# Altium integrated library Integrated_Library1.IntLib: 249 symbols (part 1 of 4) (continued)
## LM5141RGER
designator U?  (value not drawn)
Manufacturer: TI(德州仪器); Add into BOM: yes; Function: 降压型; Input Voltage: 3.8V~65V; Switching Frequency: 440kHz；2.2MHz; Synchronous Rectification: 否; Number of Outputs: 1; Topology: 降压式; Switch tube (built-in/external): 外置; Symbol: LM5141RGER; Device: LM5141RGER; LCSC Part Name: LM5141RGER; Supplier Part: C2658020; Manufacturer Part: LM5141RGER; Supplier Footprint: VQFN-24-EP(4x4); JLCPCB Part Class: Extended Part; Datasheet: https://www.ti.com/cn/lit/gpn/lm5141; Supplier: LCSC; Convert to PCB: yes; Operating Temperature: -40℃~+150℃@(TJ)
footprint VQFN-24_L4.0-W4.0-P0.50-TL-EP2.5
3D model VQFN-24_L4.0-W4.0-P0.50-TL-EP2.5
pins: 1 DEMB, 2 VDDA, 3 AGND, 4 RT, 5 DITH, 6 OSC, 7 LOL, 8 LO, 9 PGND, 10 VCC, 11 HB, 12 SW, 13 HO, 14 HOL, 15 VIN, 16 VCCX, 17 VOUT, 18 CS, 19 FB, 20 COMP, 21 PG, 22 SS, 23 EN, 24 RES, 25 EP

## LM5146RGYR
designator U?  (value not drawn)
Manufacturer: TI(德州仪器); Add into BOM: yes; Function: 降压型; Input Voltage: 5.5V~100V; Switching Frequency: 1MHz; Synchronous Rectification: 是; Number of Outputs: 1; Topology: 降压式; Switch tube (built-in/external): 外置; Symbol: LM5146RGYR; Device: LM5146RGYR; LCSC Part Name: LM5146RGYR; Supplier Part: C3188679; Manufacturer Part: LM5146RGYR; Supplier Footprint: VQFN-20(3.5x4.5); JLCPCB Part Class: Extended Part; Datasheet: https://www.ti.com/cn/lit/gpn/lm5146; Supplier: LCSC; Convert to PCB: yes; Operating Temperature: -40℃~+150℃@(TJ)
footprint VQFN-20_L4.5-W3.5-P0.50-BL-EP
3D model VQFN-20_L4.5-W3.5-H1.0-P0.50-BL-EP
pins: 1 EN/UVLO, 2 RT, 3 SS/TRK, 4 COMP, 5 FB, 6 AGND, 7 SYNCOUT, 8 SYNCIN, 9 NC, 10 PGOOD, 11 ILIM, 12 PGND, 13 LO, 14 VCC, 15 EP, 16 NC, 17 BST, 18 HO, 19 SW, 20 VIN, 21 EP

## LM25116MHX/NOPB
designator U?  (value not drawn)
Manufacturer: TI(德州仪器); Add into BOM: yes; Function: 降压型; Input Voltage: 6V~42V; Switching Frequency: 1MHz; Synchronous Rectification: 是; Number of Outputs: 1; Topology: 降压式; Switch tube (built-in/external): 外置; Symbol: LM25116MHX/NOPB; Device: LM25116MHX/NOPB; LCSC Part Name: LM25116MHX/NOPB; Supplier Part: C390951; Manufacturer Part: LM25116MHX/NOPB; Supplier Footprint: HTSSOP-20-EP; JLCPCB Part Class: Extended Part; Datasheet: https://www.ti.com/cn/lit/gpn/lm25116; Supplier: LCSC; Convert to PCB: yes; Operating Temperature: -40℃~+125℃@(TJ)
footprint HTSSOP-20_L6.5-W4.4-P0.65-LS6.4-BL-EP
3D model HTSSOP-20_L6.5-W4.4-H1.2-LS6.4-P0.65
pins: 1 VIN, 2 UVLO, 3 RT/SYNC, 4 EN, 5 RAMP, 6 AGND, 7 SS, 8 FB, 9 COMP, 10 VOUT, 11 DEMB, 12 CS, 13 CSG, 14 PGND, 15 LO, 16 VCC, 17 VCCX, 18 HB, 19 HO, 20 SW, 21 EP

## LM66100DCKR
designator U?  (value not drawn)
理想二极管; Manufacturer: TI(德州仪器); Device: LM66100DCKR_C2869734; Add into BOM: yes; Number of Outputs: 1; Control Input Logic: 低电平有效; Output Current: 1.5A; Input Voltage: 1.5V~5.5V; Resistor On-State: 79mΩ; Symbol: LM66100DCKR; LCSC Part Name: 5.5V 1.5A 低静态电流理想二极管; Supplier Part: C2869734; Manufacturer Part: LM66100DCKR; Supplier Footprint: SC-70-6; JLCPCB Part Class: Extended Part; Datasheet: https://www.ti.com/cn/lit/gpn/lm66100; Supplier: LCSC; Convert to PCB: yes; Switch Type: 理想二极管; Operating Temperature	-: -40℃~+125℃
footprint SC-70-6_L2.0-W1.3-P0.65-LS2.1-BL
3D model SC-70-6_L2.0-W1.3-P0.65-LS2.1-BL
pins: 1 VIN, 2 GND, 3 CE#, 4 NC, 5 ST, 6 VOUT

## LT3790
designator U?, comment LT3790EFE
DC-DC BUCK-BOOST芯片
footprint TSSOP38
pins: BG1, BG2, BST1, BST2, C/10, CCM, CLKOUT, CTRL, EN, FB, INTVcc, ISMON, ISN, ISP, IVINMON, IVINN, IVINP, OVLO, PGND, PGND, PWM, PWMOUT, RT, SGND, SHORT, SNSN, SNSP, SS, SW1, SW2, SYNC, TG1, TG2, Vc, VIN, Vref
text: -; +; SHDN_INT; REGS; A=20; A2; A1; A=24; ISMON_INT; IVINMON_INT; TSD; A13; A3; 3uA; A4; 1.2V; BUCK; LOGIC; SS_R/S; INTVCC; A14; SLOPE_COMP_BUCK; A15; BOOST; SLOPE_COMP_BOOST; A16; OSC; 0.4V; A7; A5; A10; 0.1V; A6; A11; 0.2V; 14uA; A8; A12; R; SS_R; Q; S; SS_S; A9; 3V; 1.75V; A18

## LTC1473
designator U?
功率电子开关
footprint 16P 0.635mm SSOP
pins: 1 IN1, 2 IN2, 3 DIODE, 4 TIMER, 5 V+, 6 Vgg, 7 SW, 8 GND, 9 GB2, 10 SAB2, 11 GA2, 12 SEN-, 13 SEN+, 14 GB1, 15 SAB1, 16 GA1

## LTC4357CDCB
designator U?
功率电子开关
footprint DFN-6_2x3_0.5
pins: 1 OUT, 2 IN, 3 GATE, 4 GND, 5 NC, 6 VDD, 7 EP

## LTC4357CMS8#PBF
designator U?  (value not drawn)
功率电子开关; Manufacturer: ADI(亚德诺); Add into BOM: yes; Input Voltage: 9V~80V; Symbol: LTC4357CMS8#PBF; Device: LTC4357CMS8#PBF; LCSC Part Name: LTC4357CMS8#PBF; Supplier Part: C107961; Manufacturer Part: LTC4357CMS8#PBF; Supplier Footprint: MSOP-8; JLCPCB Part Class: Extended Part; Datasheet: https://atta.szlcsc.com/upload/public/pdf/source/20170413/1492062869392.pdf; Supplier: LCSC; Convert to PCB: yes; Operating Temperature	-: 0℃~+70℃
footprint MSOP-8_L3.0-W3.0-P0.65-LS4.9-BL
pins: 1 IN, 2 NV, 3 NC, 4 GATE, 5 GND, 6 NC, 7 VDD, 8 OUT

## LTC4444EMS8E#PBF
designator U?  (value not drawn)
栅极驱动器; Manufacturer: ADI(亚德诺); Add into BOM: yes; Driven Configuration: 半桥; Load Type: MOSFET; Number of Drivers: 2; Peak Output Current(sink): 3A; Peak Output Current(source): 2.5A; Supply Voltage: 7.2V~13.5V; Rise Time: 8ns; Fall Time: 5ns; Symbol: LTC4444EMS8E#PBF; Device: LTC4444EMS8E#PBF; LCSC Part Name: 高电压同步 N 沟道 MOSFET 驱动器; Supplier Part: C107974; Manufacturer Part: LTC4444EMS8E#PBF; Supplier Footprint: MSOP-8-EP; JLCPCB Part Class: Extended Part; Datasheet: https://atta.szlcsc.com/upload/public/pdf/source/20170413/1492062873617.pdf; Supplier: LCSC; Convert to PCB: yes; Operating Temperature: -40℃~+125℃@(Tj)
footprint MSOP-8_L3.0-W3.0-P0.65-LS5.0-BL-EP
3D model MSOP-8_L3.0-W3.0-P0.65-LS5.0-BR-EP
pins: 1 TINP, 2 BINP, 3 VCC, 4 BG, 5 NC, 6 BOOST, 7 TG, 8 TS, 9 EP

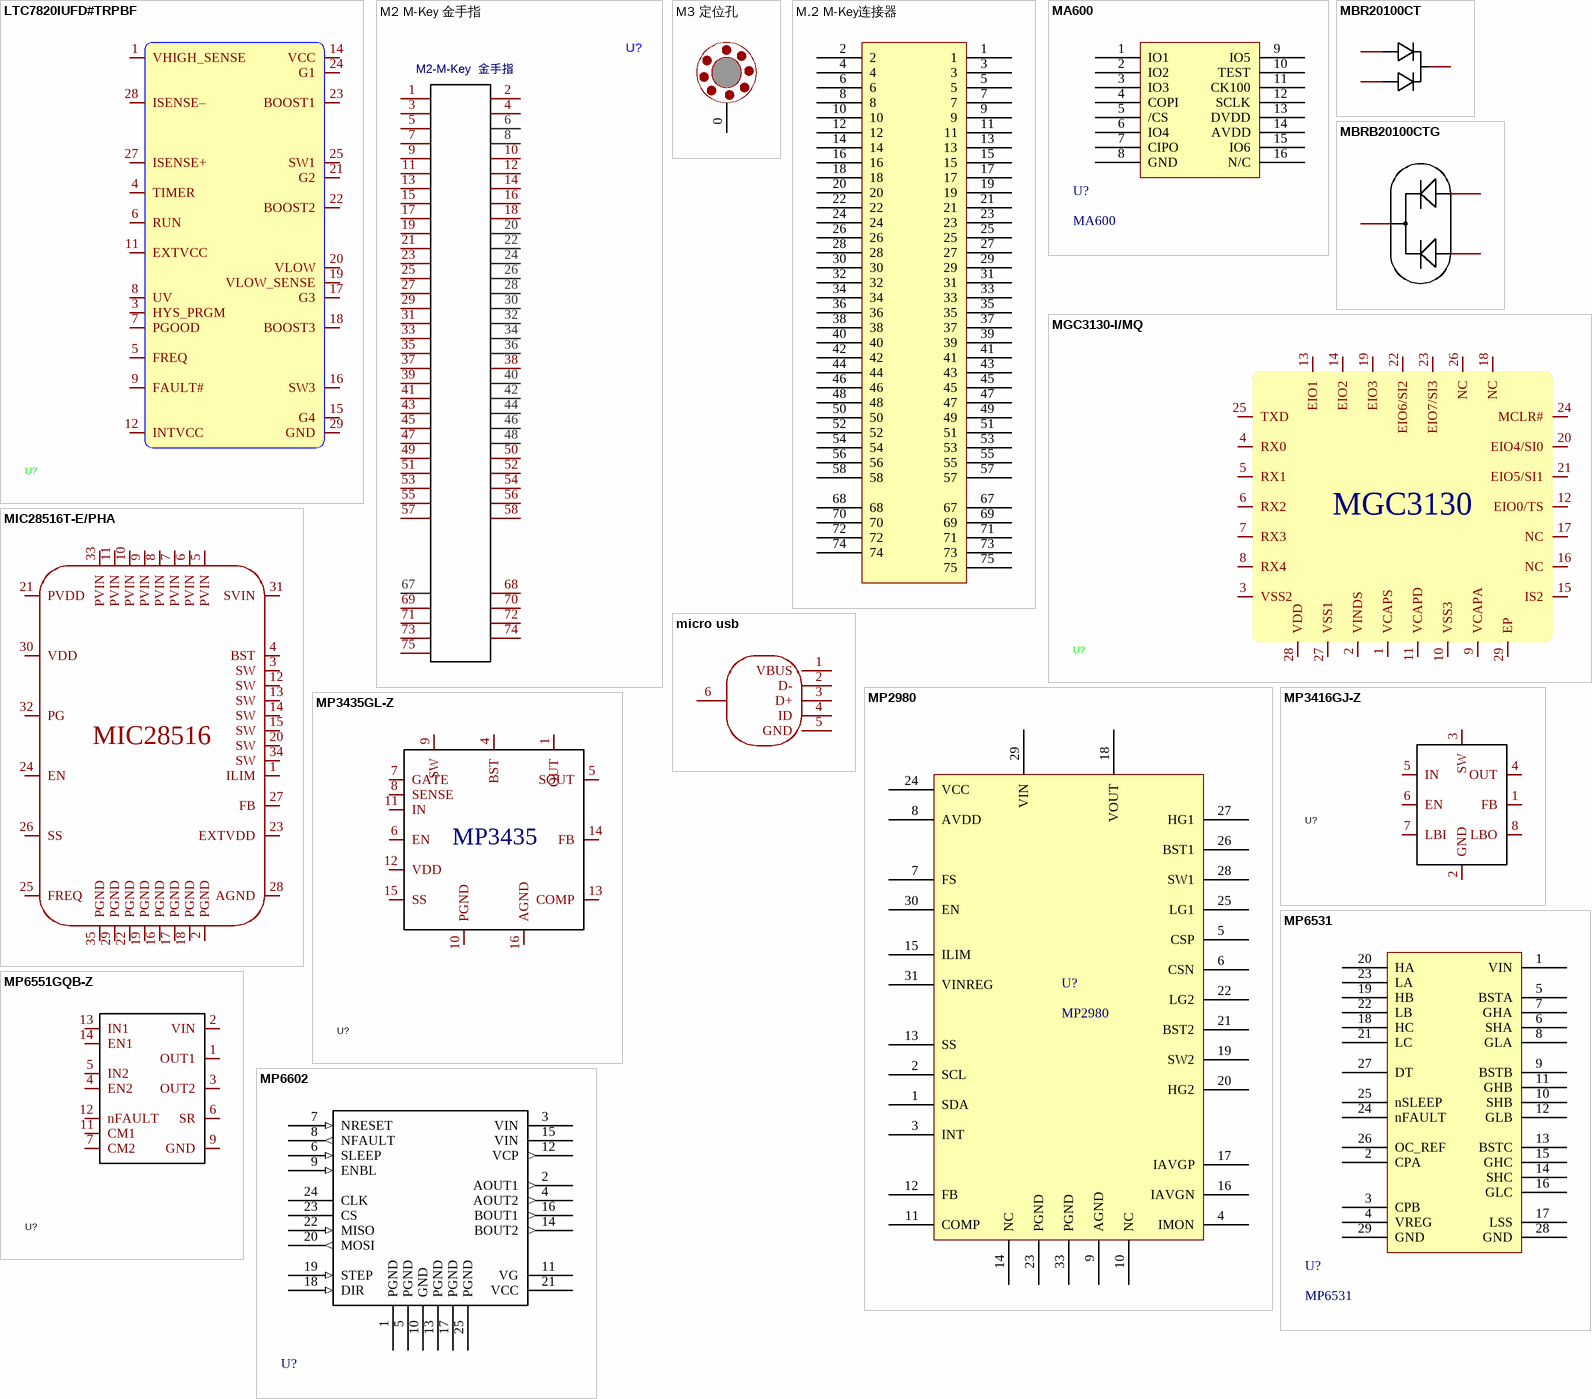
[diagram p5: symbols LTC7820IUFD#TRPBF to MP6602]

## LTC7820IUFD#TRPBF
designator U?  (value not drawn)
Manufacturer: ADI(亚德诺); Add into BOM: yes; Input Voltage: 6V~72V; Switching Frequency: 100kHz~1MHz; Synchronous Rectification: 否; Number of Outputs: 1; Switch tube (built-in/external): 外置; Symbol: LTC7820IUFD#TRPBF; Device: LTC7820IUFD#TRPBF; LCSC Part Name: 高效率非隔离中间总线转换器; Supplier Part: C690244; Manufacturer Part: LTC7820IUFD#TRPBF; Supplier Footprint: QFN-28-EP(4x5); JLCPCB Part Class: Extended Part; Datasheet: https://atta.szlcsc.com/upload/public/pdf/source/20210527/C690244_405FC637E178150A18F1B63D64F3DC46.pdf; Supplier: LCSC; Convert to PCB: yes; Function: -; Output Type: -; Output Voltage: -; Output Current: -; Operating Temperature: -40℃~+125℃; Topology: -; Quiescent Current (Iq): -
footprint QFN-28_L5.0-W4.0-P0.50-TL-EP-1
3D model QFN-28_L5.0-W4.0-P0.50-TL-EP-1
pins: 1 VHIGH_SENSE, 3 HYS_PRGM, 4 TIMER, 5 FREQ, 6 RUN, 7 PGOOD, 8 UV, 9 FAULT#, 11 EXTVCC, 12 INTVCC, 14 VCC, 15 G4, 16 SW3, 17 G3, 18 BOOST3, 19 VLOW_SENSE, 20 VLOW, 21 G2, 22 BOOST2, 23 BOOST1, 24 G1, 25 SW1, 27 ISENSE+, 28 ISENSE–, 29 GND

## M2 M-Key 金手指
designator U?
footprint M.2-M Key
pins: 1 CONFIG_3, 2 3.3V, 3 GND, 4 3.3V, 5 GND, 6 N/C, 7 N/C, 8 N/C, 9 N/C, 10 DAS/DSS #, 11 GND, 12 3.3V, 13 N/C, 14 3.3V, 15 N/C, 16 3.3V, 17 N/C, 18 3.3V, 19 N/C, 20 N/C, 21 CONFIG_0, 22 N/C, 23 Reserved, 24 N/C, 25 Reserved, 26 N/C, 27 GND, 28 N/C, 29 PETn1, 30 N/C, 31 PETp1, 32 N/C, 33 GND, 34 N/C, 35 PERn1, 36 N/C, 37 PERp1, 38 DEVSLP, 39 GND, 40 N/C, 41 PETn0, 42 N/C, 43 PETp0, 44 N/C, 45 GND, 46 N/C, 47 PERn0, 48 N/C, 49 PERp0, 50 PERST #, 51 GND, 52 CLKREQ #, 53 REFCLKN, 54 PEWake #, 55 REFCLKP, 56 Reserved / MFG Data, 57 GND, 58 Reserved / MFG Clock, 67 N/C, 68 SUSCLK(32kHz), 69 CONFIG_1, 70 3.3V, 71 GND, 72 3.3V, 73 GND, 74 3.3V, 75 CONFIG_2
text: M2-M-Key  金手指

## M3 定位孔
designator P2  (value not drawn)
footprint VIA-3mm
pins: 0 GND

## M.2 M-Key连接器
designator ?, comment M.2_M_key_F  (value not drawn)
footprint M.2_M_key_F(H=8.5mm) (PCIe M.2 Connectors, Storage and Server Connector, P=0.5mm, H=8.5mm, Key M)
pins: 1, 2, 3, 4, 5, 6, 7, 8, 9, 10, 11, 12, 13, 14, 15, 16, 17, 18, 19, 20, 21, 22, 23, 24, 25, 26, 27, 28, 29, 30, 31, 32, 33, 34, 35, 36, 37, 38, 39, 40, 41, 42, 43, 44, 45, 46, 47, 48, 49, 50, 51, 52, 53, 54, 55, 56, 57, 58, 67, 68, 69, 70, 71, 72, 73, 74, 75

## MA600
designator U?
磁编码器
footprint qfn-16-l3.0-w3.0-p0.50-tl-ep1.7
pins: 1 IO1, 2 IO2, 3 IO3, 4 COPI, 5 /CS, 6 IO4, 7 CIPO, 8 GND, 9 IO5, 10 TEST, 11 CK100, 12 SCLK, 13 DVDD, 14 AVDD, 15 IO6, 16 N/C

## MBR20100CT
designator D?  (value not drawn)
共阴极直插双二极管; Manufacturer: MDD; Symbol: MBR20100CT_C173465; Add into BOM: yes; Forward Voltage (Vf@If): 850mV@10A; Reverse Voltage (Vr): 100V; Average Rectified Current (Io): 10A; Device: MBR20100CT_C173465; Supplier: LCSC; Supplier Part: C173465; Manufacturer Part: MBR20100CT; JLCPCB Part Class: Extended Part; LCSC Part Name: 电压:100V 电流:10A; Supplier Footprint: TO-220AB-3; Datasheet: https://atta.szlcsc.com/upload/public/pdf/source/20230823/019C3101C6749BCDCCD7AF8DE8E356AE.pdf; Convert to PCB: yes
footprint TO-220AB-3_L10.4-W4.6-P2.54-T
pins: 1 A, 2 C, 3 A

## MBRB20100CTG
designator D?  (value not drawn)
功率二极管; Manufacturer: onsemi(安森美); Add into BOM: yes; Diode Configuration: 1对共阴极; Forward Voltage (Vf@If): 850mV@35A; Reverse Voltage (Vr): 100V; Average Rectified Current (Io): 10A; Reverse Leakage Current: 100uA@100V; Symbol: MBRB20100CTG; Device: MBRB20100CTG; Supplier: LCSC; Manufacturer Part: MBRB20100CTG; Supplier Part: C90225; JLCPCB Part Class: Extended Part; LCSC Part Name: 电压:100V 电流:10A; Supplier Footprint: D2PAK; Datasheet: https://atta.szlcsc.com/upload/public/pdf/source/20171014/C92093_15079757884501038571.PDF; Convert to PCB: yes; Power Dissipation: -; Reverse Recovery Time (trr): -; Operating Temperature: -65℃~+175℃@(Tj)
footprint TO-263-2_L10.0-W9.1-P5.08-LS15.2-BR
pins: 1, 3, 4

## MGC3130-I/MQ
designator U?  (value not drawn)
电场传感器; Manufacturer: MICROCHIP(美国微芯); Add into BOM: yes; Symbol: MGC3130-I/MQ; Device: MGC3130-I/MQ; LCSC Part Name: MGC3130-I/MQ; Supplier Part: C512194; Manufacturer Part: MGC3130-I/MQ; Supplier Footprint: QFN-28-EP(5x5); JLCPCB Part Class: Extended Part; Datasheet: https://atta.szlcsc.com/upload/public/pdf/source/20200413/C512194_23B186B1FC72104BFBFAAE77C56BA81C.pdf; Supplier: LCSC; Convert to PCB: yes
footprint QFN-28_L5.0-W5.0-P0.50-BL-EP
3D model TQFN-28_L5.0-W5.0-H0.8-P0.50
pins: 1 VCAPS, 2 VINDS, 3 VSS2, 4 RX0, 5 RX1, 6 RX2, 7 RX3, 8 RX4, 9 VCAPA, 10 VSS3, 11 VCAPD, 12 EIO0/TS, 13 EIO1, 14 EIO2, 15 IS2, 16 NC, 17 NC, 18 NC, 19 EIO3, 20 EIO4/SI0, 21 EIO5/SI1, 22 EIO6/SI2, 23 EIO7/SI3, 24 MCLR#, 25 TXD, 26 NC, 27 VSS1, 28 VDD, 29 EP
text: MGC3130

## MIC28516T-E/PHA
designator U?  (value not drawn)
Manufacturer: MICROCHIP(美国微芯); Add into BOM: yes; Function: 降压型; Output Type: 可调; Input Voltage: 4.5V~70V; Output Voltage: 600mV~32V; Output Current (Max): 8A; Switching Frequency: 800kHz; Synchronous Rectification: 是; Number of Outputs: 1; Topology: 降压式; Switch tube (built-in/external): 内置; Symbol: MIC28516T-E/PHA; Device: MIC28516T-E/PHA; LCSC Part Name: MIC28516T-E/PHA; Supplier Part: C623942; Manufacturer Part: MIC28516T-E/PHA; Supplier Footprint: VQFN-32-EP(6x6); JLCPCB Part Class: Extended Part; Datasheet: https://atta.szlcsc.com/upload/public/pdf/source/20221017/C1D171D455CD6BE8225348A688198F53.pdf; Supplier: LCSC; Convert to PCB: yes; Operating Temperature: -40℃~+125℃@(TJ)
footprint VQFN-32_L6.0-W6.0-P0.65-BL-EP_MIC28514T-E-PHA
3D model VQFN-32_L6.0-W6.0-P0.65-BL-EP_MIC28514T-E-PHA
pins: 1 ILIM, 2 PGND, 3 SW, 4 BST, 5 PVIN, 6 PVIN, 7 PVIN, 8 PVIN, 9 PVIN, 10 PVIN, 11 PVIN, 12 SW, 13 SW, 14 SW, 15 SW, 16 PGND, 17 PGND, 18 PGND, 19 PGND, 20 SW, 21 PVDD, 22 PGND, 23 EXTVDD, 24 EN, 25 FREQ, 26 SS, 27 FB, 28 AGND, 29 PGND, 30 VDD, 31 SVIN, 32 PG, 33 PVIN, 34 SW, 35 PGND
text: MIC28516

## micro usb
designator USB?, comment MICRO 6.4JB  (value not drawn)
Manufacturer: SHOU HAN(首韩); Add into BOM: yes; Connector Type: Micro-B; Gender: 母; Number of Contacts: 5P; Number of Ports: 1; Current Rating - Power (Max): 1A; Connect-Disconnect Life: 1万次; Core Colour: 黑色; Symbol: MICRO 6.4JB; Device: MICRO 6.4JB; LCSC Part Name: Micro-B 母 卧贴; Supplier Part: C2681558; Manufacturer Part: MICRO 6.4JB; Supplier Footprint: SMD; JLCPCB Part Class: Extended Part; Datasheet: https://atta.szlcsc.com/upload/public/pdf/source/20210107/C2681558_CE87DAC76B0B6D6A8499512BD182790B.pdf; Supplier: LCSC; Convert to PCB: yes; Standard: USB 2.0; Mounting Style: 卧贴; Operating Temperature Range: -20℃~+65℃
footprint MICRO-USB-SMD_C2681558
pins: 1 VBUS, 2 D-, 3 D+, 4 ID, 5 GND, 6 EH

## MP2980
designator U?
BUCK-BOOST Controller
footprint QFN-32 4x4
pins: 1 SDA, 2 SCL, 3 INT, 4 IMON, 5 CSP, 6 CSN, 7 FS, 8 AVDD, 9 AGND, 10 NC, 11 COMP, 12 FB, 13 SS, 14 NC, 15 ILIM, 16 IAVGN, 17 IAVGP, 18 VOUT, 19 SW2, 20 HG2, 21 BST2, 22 LG2, 23 PGND, 24 VCC, 25 LG1, 26 BST1, 27 HG1, 28 SW1, 29 VIN, 30 EN, 31 VINREG, 33 PGND

## MP3416GJ-Z
designator U?, comment MP3416  (value not drawn)
Manufacturer: MPS(芯源); Symbol: MP3416GJ-Z; Add into BOM: yes; Function: 升压型; Input Voltage: 860mV~5.5V; Output Voltage: 1.8V~5.5V; Output Current: 1.1A; Synchronous Rectification: 是; Number of Outputs: 1; Topology: 升压式; Switch tube (built-in/external): 内置; Device: MP3416GJ-Z; LCSC Part Name: MP3416GJ-Z; Supplier Part: C5296924; Manufacturer Part: MP3416GJ-Z; Supplier Footprint: TSOT-23-8; JLCPCB Part Class: Extended Part; Datasheet: https://atta.szlcsc.com/upload/public/pdf/source/20240129/EB0CD8F9BC2F8342E0AF20A01EF4823F.pdf; Supplier: LCSC; Convert to PCB: yes; Operating Temperature: -40℃~+125℃@(TJ)
footprint TSOT-23-8_L3.0-W1.7-P0.65-LS2.8-BL
pins: 1 FB, 2 GND, 3 SW, 4 OUT, 5 IN, 6 EN, 7 LBI, 8 LBO

## MP3435GL-Z
designator U?, comment MP3435  (value not drawn)
Manufacturer: MPS(芯源); Symbol: MP3435GL-Z; Add into BOM: yes; Function: 升压型; Output Type: 可调; Input Voltage: 3V~20V; Output Voltage: 3V~22V; Output Current: 19A; Switching Frequency: 600kHz; Synchronous Rectification: 是; Number of Outputs: 1; Topology: 升压式; Switch tube (built-in/external): 内置; Device: MP3435GL-Z; LCSC Part Name: MP3435GL-Z; Supplier Part: C6910133; Manufacturer Part: MP3435GL-Z; Supplier Footprint: QFN-20(3x4); JLCPCB Part Class: Extended Part; Datasheet: https://atta.szlcsc.com/upload/public/pdf/source/20240130/7384AF986445C9AAC7DE117408629C04.pdf; Supplier: LCSC; Convert to PCB: yes; Operating Temperature: -40℃~+125℃@(TJ)
footprint QFN-20_L4.0-W3.0_MP3435GL-Z
pins: 1 OUT, 4 BST, 5 SOUT, 6 EN, 7 GATE, 8 SENSE, 9 SW, 10 PGND, 11 IN, 12 VDD, 13 COMP, 14 FB, 15 SS, 16 AGND

## MP6531
designator U?
FOC算法芯片
footprint QFN-28_L4.0-W4.0-P0.40-TL-EP2.6
pins: 1 VIN, 2 CPA, 3 CPB, 4 VREG, 5 BSTA, 6 SHA, 7 GHA, 8 GLA, 9 BSTB, 10 SHB, 11 GHB, 12 GLB, 13 BSTC, 14 SHC, 15 GHC, 16 GLC, 17 LSS, 18 HC, 19 HB, 20 HA, 21 LC, 22 LB, 23 LA, 24 nFAULT, 25 nSLEEP, 26 OC_REF, 27 DT, 28 GND, 29 GND

## MP6551GQB-Z
designator U?, comment MP6551  (value not drawn)
Manufacturer: MPS(芯源); Symbol: MP6551GQB-Z; Add into BOM: yes; Device: MP6551GQB-Z; LCSC Part Name: 5A 有刷直流电机驱动芯片 14V; Supplier Part: C3681210; Manufacturer Part: MP6551GQB-Z; Supplier Footprint: QFN-14(2.5x3); JLCPCB Part Class: Extended Part; Datasheet: https://atta.szlcsc.com/upload/public/pdf/source/20240315/87D2DCD0FE587502246AD273A573ED89.pdf; Supplier: LCSC; Convert to PCB: yes
footprint QFN-14_L3.0-W2.5-P0.50-TL_MP6551GQB-Z
pins: 1 OUT1, 2 VIN, 3 OUT2, 4 EN2, 5 IN2, 6 SR, 7 CM2, 9 GND, 11 CM1, 12 nFAULT, 13 IN1, 14 EN1

## MP6602
designator U?  (value not drawn)
步进电机驱动器MP6602
footprint QFN-25(4x5)
pins: 1 PGND (power), 2 AOUT1 (out), 3 VIN (power), 4 AOUT2 (out), 5 PGND (power), 6 SLEEP (in), 7 NRESET (in), 8 NFAULT (out), 9 ENBL (in), 10 GND (power), 11 VG, 12 VCP (out), 13 PGND (power), 14 BOUT2 (out), 15 VIN (power), 16 BOUT1 (out), 17 PGND (power), 18 DIR (in), 19 STEP (in), 20 MOSI (out), 21 VCC (power), 22 MISO (in), 23 CS, 24 CLK, 25 PGND (power)

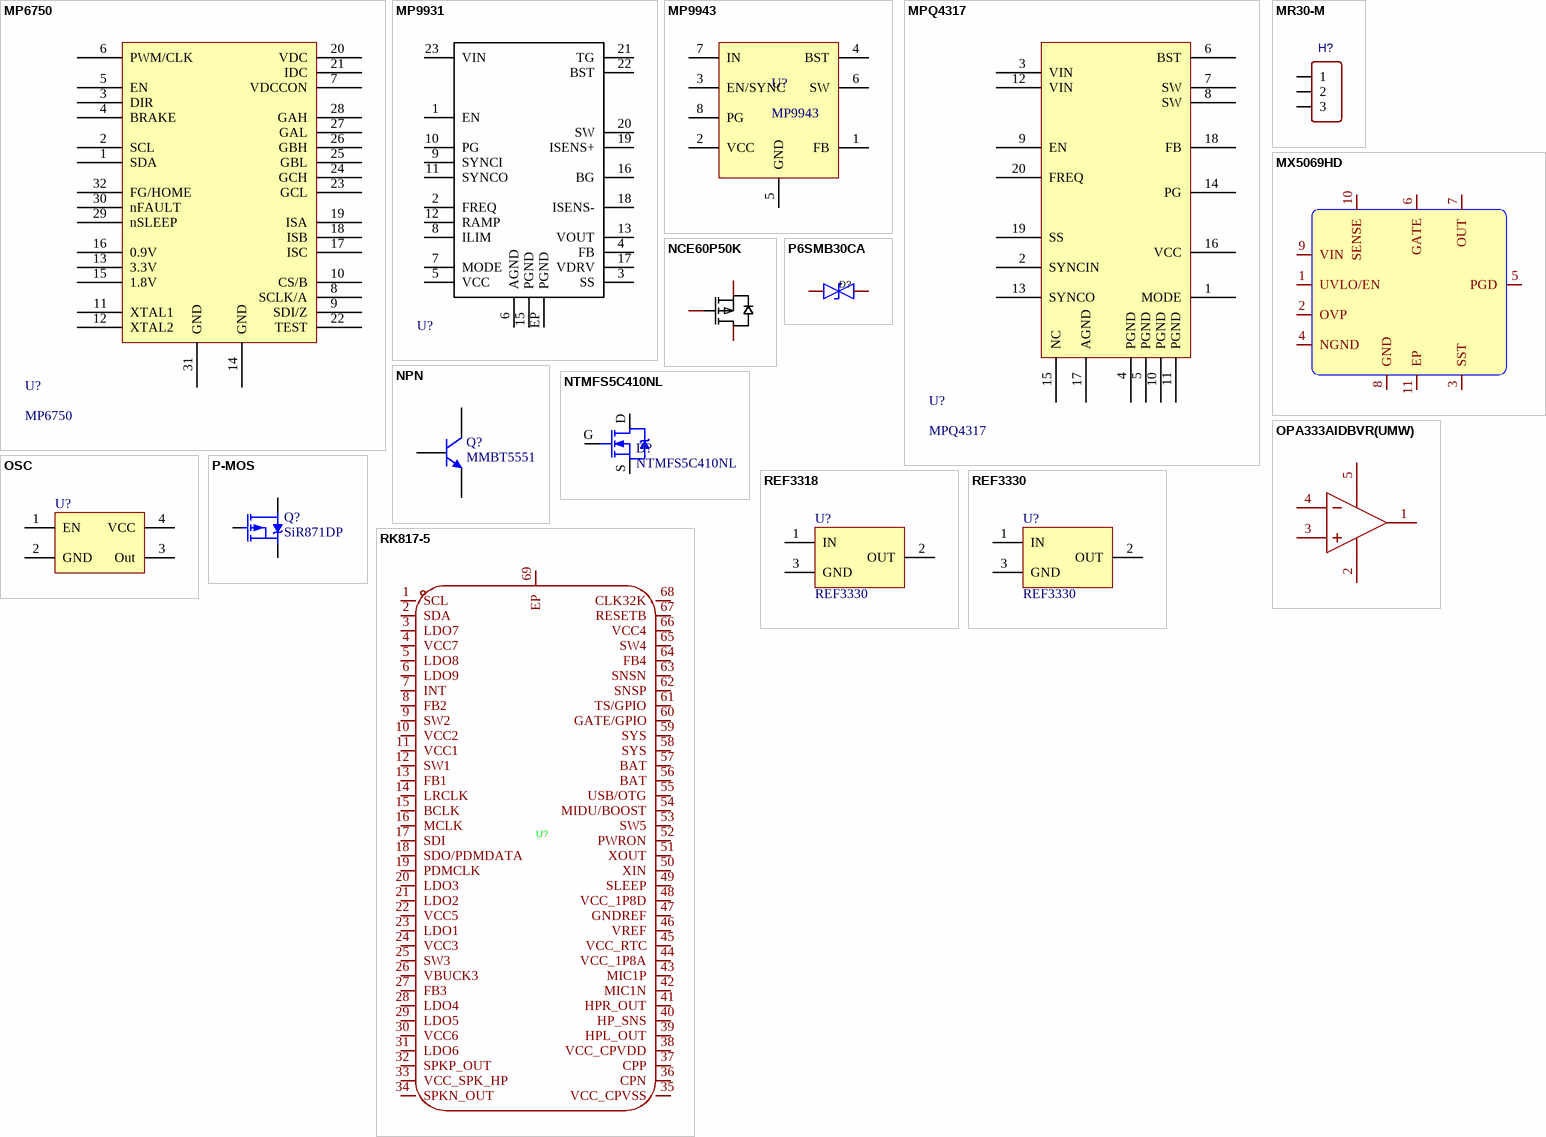
[diagram p6: symbols MP6750 to RK817-5]

## MP6750
designator U?
FOC算法芯片
footprint QFN-32 4x4
pins: 1 SDA, 2 SCL, 3 DIR, 4 BRAKE, 5 EN, 6 PWM/CLK, 7 VDCCON, 8 SCLK/A, 9 SDI/Z, 10 CS/B, 11 XTAL1, 12 XTAL2, 13 3.3V, 14 GND, 15 1.8V, 16 0.9V, 17 ISC, 18 ISB, 19 ISA, 20 VDC, 21 IDC, 22 TEST, 23 GCL, 24 GCH, 25 GBL, 26 GBH, 27 GAL, 28 GAH, 29 nSLEEP, 30 nFAULT, 31 GND, 32 FG/HOME

## MP9931
designator U?  (value not drawn)
100V BUCK Controller
footprint QFN-23(4x4)
pins: 1 EN, 2 FREQ, 3 SS, 4 FB, 5 VCC, 6 AGND, 7 MODE, 8 ILIM, 9 SYNCI, 10 PG, 11 SYNCO, 12 RAMP, 13 VOUT, 15 PGND, 16 BG, 17 VDRV, 18 ISENS-, 19 ISENS+, 20 SW, 21 TG, 22 BST, 23 VIN, EP PGND

## MP9943
designator U?
BUCK Convertor 3A
footprint QFN-8 3x3
pins: 1 FB, 2 VCC, 3 EN/SYNC, 4 BST, 5 GND, 6 SW, 7 IN, 8 PG

## MPQ4317
designator U?
BUCK Convertor 7A
footprint QFN-20 4x4mm
pins: 1 MODE, 2 SYNCIN, 3 VIN, 4 PGND, 5 PGND, 6 BST, 7 SW, 8 SW, 9 EN, 10 PGND, 11 PGND, 12 VIN, 13 SYNCO, 14 PG, 15 NC, 16 VCC, 17 AGND, 18 FB, 19 SS, 20 FREQ

## MR30-M
designator H?  (value not drawn)
BOM_Manufacturer: AMASS(艾迈斯); Contributor: LCEDA_Lib; BOM_Supplier Part: C99873; BOM_Supplier: LCSC; BOM_Manufacturer Part: MR30-M; spicePre: H; spiceSymbolName: HDR-F-2.54_1x3
footprint MR30
pins: 1, 2, 3

## MX5069HD
designator U?  (value not drawn)
Manufacturer: Wuxi Maxinmicro(无锡明芯微); Add into BOM: yes; Symbol: MX5069HD; Device: MX5069HD; LCSC Part Name: 耐负压高边开关; Supplier Part: C20882981; Manufacturer Part: MX5069HD; Supplier Footprint: DFN-10L(3x3); JLCPCB Part Class: Extended Part; Datasheet: https://atta.szlcsc.com/upload/public/pdf/source/20240301/1A26D34E4AE9D9883961EE5917F439E6.pdf; Supplier: LCSC; Convert to PCB: yes
footprint WDFN-10L_L3.0-W3.0-P0.50-BL-EP
3D model WDFN-10_L3.0-W3.0-H0.8-P0.50
pins: 1 UVLO/EN, 2 OVP, 3 SST, 4 NGND, 5 PGD, 6 GATE, 7 OUT, 8 GND, 9 VIN, 10 SENSE, 11 EP